# Altium footprint library bethu.PcbLib: 628 footprints (part 5 of 40)
Each footprint in its own frame and in the unit in brackets; x right, y up, seen from the top. Pads: shape width x height; smd on the part's side, far side on the other; paste and mask are expansions set on the pad; w line width, h text height; cw(c..) or ccw(c..) is an arc to the next point about the centre after c.
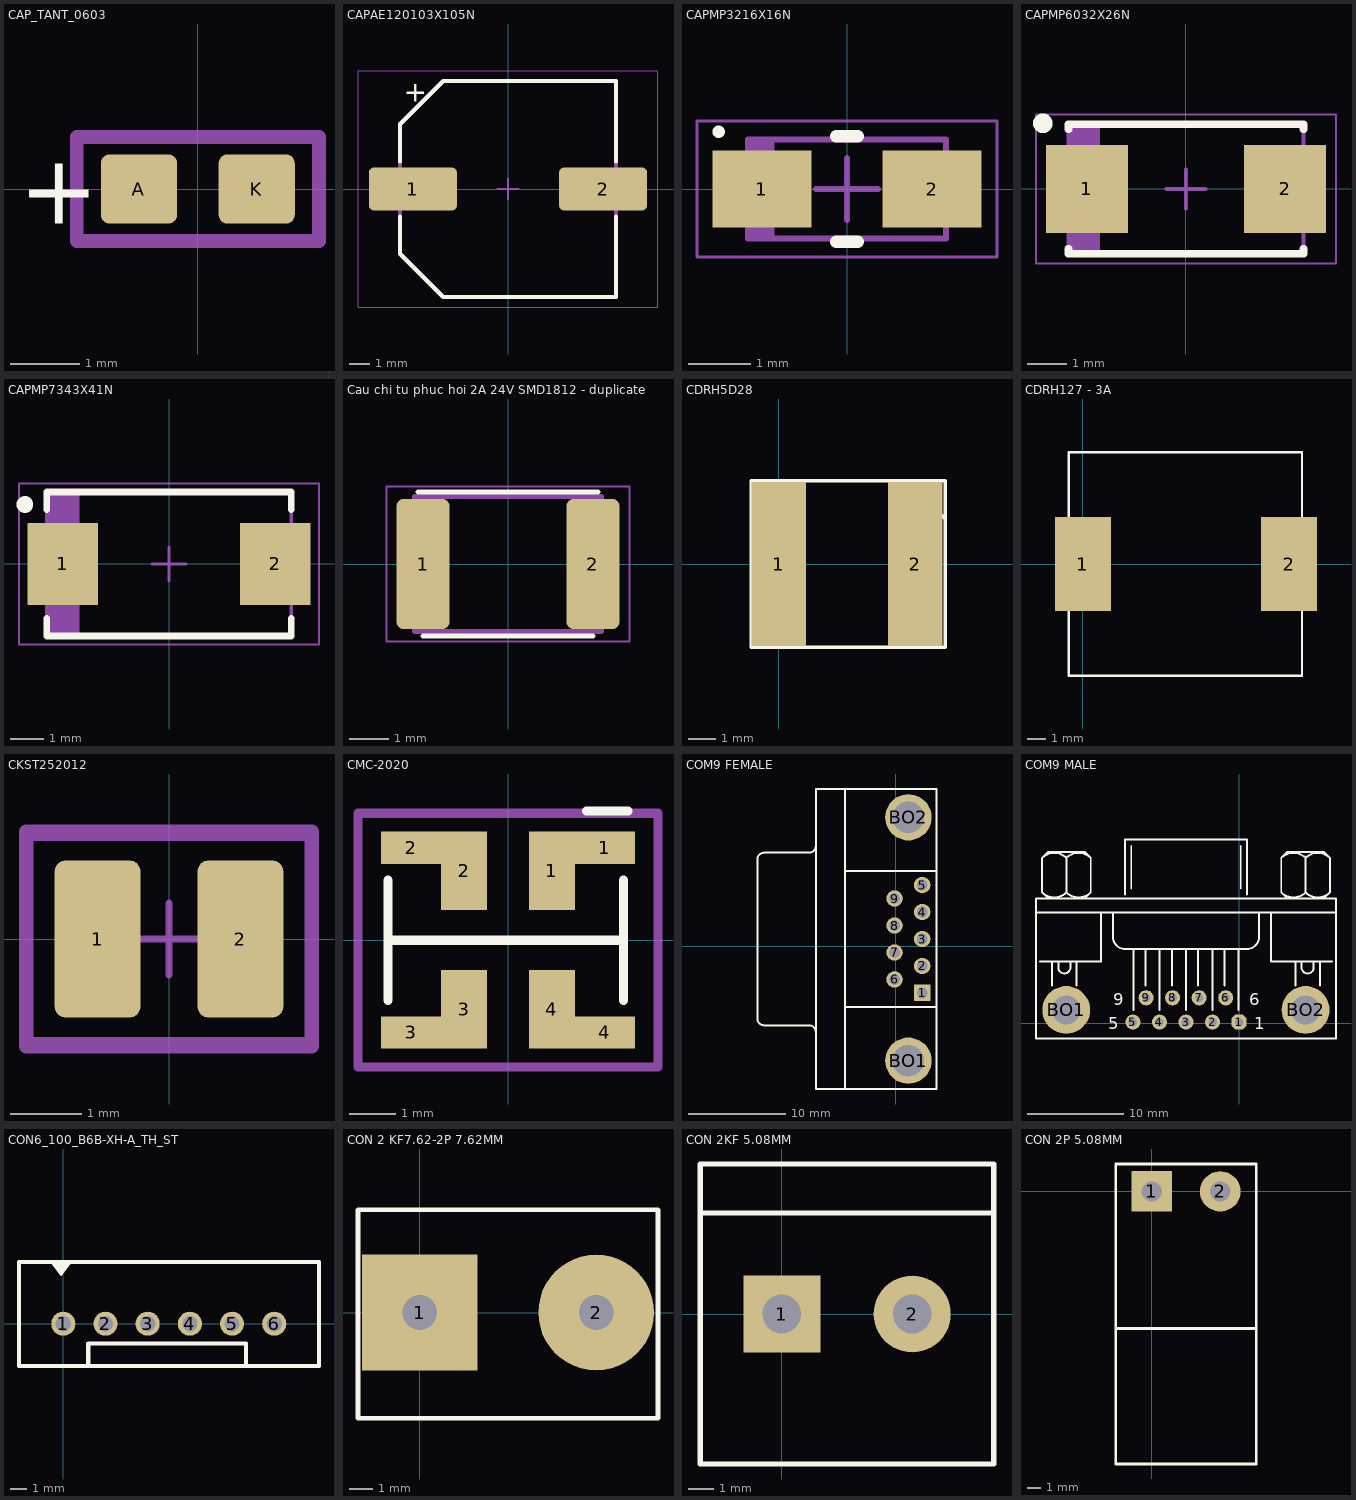
[diagram p4: the footprints below, top view; thin cyan lines are the x and y axes]

## CAP_TANT_0603 [mm]
pads (2):
  rrect25% 1.1x1 smd: A(-0.85,0) K(0.85,0)
Top Overlay:
  text "+" at -2.583,-0.5 h1
Mechanical 13:
  lines w0.2: -1.75,-0.75 1.75,-0.75 1.75,0.75 -1.75,0.75 -1.75,-0.75
  text ".Designator" at -4.998,-0.333 h1
  text "+" at -1.333,1 h1
3D body "CAP_TANT_0603.step": height 0.91, standoff 0.01, extent -0.9,-0.525 0.9,0.525

## CAPAE120103X105N [mm] "Aluminum Electrolytic Capacitor, Body 10.30x10.30x10.50mm, IPC Medium Density"
height 10.5
pads (2):
  rrect25% 4.3x2.1 smd: 1(-4.625,0) 2(4.625,0)
Top Overlay:
  lines w0.2: -5.25,-1.35 -5.25,-3.15 -3.15,-5.25 5.25,-5.25 5.25,-1.35 ; -5.25,1.35 -5.25,3.15 -3.15,5.25 5.25,5.25 5.25,1.35
  text "+" at -5.083,4.25 h1
Mechanical 13:
  lines w0.2: -5.25,-3.15 -3.15,-5.25 5.25,-5.25 5.25,5.25 -3.15,5.25 -5.25,3.15 -5.25,-3.15
  text "'.Designator'" at -5.665,-0.417 h1
  text "+" at -5.083,4.25 h1
Mechanical 15:
  lines w0.05: -7.3,-5.75 -7.3,5.75 7.3,5.75 7.3,-5.75 -7.3,-5.75
  lines w0.1: -0.5,0 0.5,0 ; 0,-0.5 0,0.5
3D body "CAPAE120103X105N.step": height 10.5, standoff 0, extent -6,-5.25 6,5.25

## CAPMP3216X16N [mm] "Molded Capacitor, 2-Leads, Body 3.20x1.60mm, IPC Medium Density"
height 1.6
pads (2):
  rect 1.6x1.25 smd: 1(-1.375,0) 2(1.375,0)
Top Overlay:
  circle w0.1: c-2.075,0.925 r0.05
  lines w0.2: -0.175,-0.85 0.175,-0.85 ; -0.175,0.85 0.175,0.85
Mechanical 13:
  rectangle: -1.6,-0.8 -1.17,0.8
  lines w0.1: -1.6,-0.8 -1.6,0.8 1.6,0.8 1.6,-0.8 -1.6,-0.8
Mechanical 15:
  lines w0.05: -2.425,-1.1 -2.425,1.1 2.425,1.1 2.425,-1.1 -2.425,-1.1
  lines w0.1: -0.5,0 0.5,0 ; 0,-0.5 0,0.5
3D body "User Library-CAP_TANT_3216-18_A_case.STEP": height 1.8, standoff 0, extent -1.7,-0.9 1.7,0.9

## CAPMP6032X26N [mm] "Molded Capacitor, 2-Leads, Body 6.00x3.20mm, IPC Medium Density"
height 2.6
pads (2):
  rect 2.1x2.25 smd: 1(-2.525,0) 2(2.525,0)
Top Overlay:
  circle w0.25: c-3.65,1.675 r0.125
  lines w0.2: -3,-1.525 -3,-1.65 3,-1.65 3,-1.525 ; -3,1.525 -3,1.65 3,1.65 3,1.525
Mechanical 13:
  rectangle: -3,-1.6 -2.193,1.6
  lines w0.1: -3,-1.6 3,-1.6 3,1.6 -3,1.6 -3,-1.6
Mechanical 15:
  lines w0.05: -3.825,-1.9 3.825,-1.9 3.825,1.9 -3.825,1.9 -3.825,-1.9
  lines w0.1: -0.5,0 0.5,0 ; 0,-0.5 0,0.5
3D body "User Library-CAP_TANT_6032-28_y.STEP": height 2.8, standoff 0, extent -3.15,-1.75 3.15,1.75

## CAPMP7343X41N [mm] "Molded Capacitor, 2-Leads, Body 7.30x4.30mm, IPC Medium Density"
height 4.1
pads (2):
  rect 2.1x2.45 smd: 1(-3.175,0) 2(3.175,0)
Top Overlay:
  circle w0.25: c-4.3,1.775 r0.125
  lines w0.2: -3.65,-1.625 -3.65,-2.15 3.65,-2.15 3.65,-1.625 ; -3.65,1.625 -3.65,2.15 3.65,2.15 3.65,1.625
Mechanical 13:
  rectangle: -3.65,-2.15 -2.668,2.15
  lines w0.1: -3.65,-2.15 3.65,-2.15 3.65,2.15 -3.65,2.15 -3.65,-2.15
Mechanical 15:
  lines w0.05: -4.475,-2.4 4.475,-2.4 4.475,2.4 -4.475,2.4 -4.475,-2.4
  lines w0.1: -0.5,0 0.5,0 ; 0,-0.5 0,0.5
3D body "User Library-CAP_TANT_7343-40.STEP": height 4, standoff 0, extent -3.8,-2.3 3.8,2.3

## Cau chi tu phuc hoi 2A 24V SMD1812 - duplicate [mm]
pads (2):
  rrect25% 1.34x3.29 smd: 1(-2.15,0) 2(2.15,0)
Top Overlay:
  lines w0.127: -2.28,1.825 2.28,1.825 ; -2.15,-1.825 2.15,-1.825
Mechanical 13:
  lines w0.127: -2.37,-1.71 -2.37,1.71 2.37,1.71 2.37,-1.71 -2.37,-1.71
Mechanical 15:
  lines w0.05: -3.07,-1.96 -3.07,1.96 3.07,1.96 3.07,-1.96 -3.07,-1.96
3D body "step_temp.STEP": height 1.25, standoff 0, extent -2.275,-1.62 2.275,1.62

## CDRH5D28 [mm] "6x6x3mm"
pads (2):
  rect 2x6 smd: 1(0,0) 2(5,0)
Top Overlay:
  lines w0.127: -1.016,-1.651 0.381,-3.048 ; 4.699,3.048 6.096,1.651 ; -1.016,-3.048 6.096,-3.048 6.096,3.048 -1.016,3.048 -1.016,-3.048
3D body "User Library-cdrh5d28.STEP": height 3, standoff 0, extent -0.508,-3 5.492,3

## CDRH127 - 3A [mm] "12x12x7mm"
pads (2):
  rect 3x5 smd: 1(0,0) 2(11,0)
Top Overlay:
  lines w0.127: -0.762,-5.969 -0.762,5.969 11.684,5.969 11.684,-5.969 -0.762,-5.969
3D body "SUMIDA-CDRH127-DEFAULT.STEP": height 7.4, standoff -0.05, extent -0.71,-6 11.632,6

## CKST252012 [mm]
height 1.2
pads (2):
  rrect25% 1.2x2.2 smd: 1(-1,0) 2(1,0)
Mechanical 13:
  lines w0.2: -2,-1.5 -2,1.5 2,1.5 2,-1.5 -2,-1.5
  text "'.Designator'" at -5.665,-0.417 h1
Mechanical 15:
  lines w0.05: -1.95,-1.4 -1.95,1.4 1.95,1.4 1.95,-1.4 -1.95,-1.4
  lines w0.1: -0.5,0 0.5,0 ; 0,-0.5 0,0.5
3D body "CKST252012.step": height 1.2, standoff 0, extent -1.35,-1.1 1.35,1.1

## CMC-2020 [mm]
height 2.5
pads (8):
  rect 1x1.7 smd: 1(0.95,1.5) 2(-0.95,1.5) 3(-0.95,-1.5) 4(0.95,-1.5)
  rect 1.3x0.7 smd: 1(2.1,2) 2(-2.1,2) 3(-2.1,-2) 4(2.1,-2)
Top Overlay:
  lines w0.2: -2.6,-1.3 -2.6,1.3 ; -2.6,0 2.5,0 ; 1.7,2.8 2.6,2.8 ; 2.5,-1.3 2.5,1.3
Mechanical 13:
  circle w0.35: c2.25,2 r0.15
  lines w0.2: -3.25,-2.75 -3.25,2.75 3.25,2.75 3.25,-2.75 -3.25,-2.75
  text "'.Designator'" at -5.665,-0.417 h1
3D body "DLW5BTM251SQ2L.STEP": height 2.51, standoff 0.01, extent -2.5,-2.5 2.5,2.5

## COM9 FEMALE [mm]
pads (11):
  rect 1.69x1.69 hole 1.09: 1(2.715,-4.78)
  round 1.69 hole 1.09: 2(2.715,-2.01) 3(2.715,0.76) 4(2.715,3.53) 5(2.715,6.3) 6(-0.125,-3.395) 7(-0.125,-0.625) 8(-0.125,2.145) 9(-0.125,4.915)
  round 4.76 hole 3.26: BO1(1.295,-11.735) BO2(1.295,13.255)
Top Overlay:
  lines w0.2: -13.51,-8.1 cw(c-13.51,-7.405) -14.205,-7.405 -14.205,8.925 cw(c-13.51,8.925) -13.51,9.62 ; -13.505,-8.105 -8.905,-8.105 cw(c-8.905,-8.8) -8.21,-8.8 ; -13.505,9.625 -8.905,9.625 ccw(c-8.905,10.32) -8.21,10.32 ; -5.205,-14.64 -5.205,16.16 ; -5.205,-6.24 4.195,-6.24 ; -5.205,7.76 4.195,7.76 ; -8.205,-14.64 -8.205,16.16 4.195,16.16 4.195,-14.64 -8.205,-14.64
3D body "User Library-DB9-Usa.STEP": height 12.77, standoff -4.1, extent -13.928,-14.643 4.372,16.167

## COM9 MALE [mil]
pads (11):
  oct 62x62 hole 35: 1(0,5)
  round 62 hole 35: 2(-109.17,5) 3(-218.33,5) 4(-327.5,5) 5(-436.67,5) 6(-55,105) 7(-164.17,105) 8(-273.33,105) 9(-382.5,105)
  round 196.67 hole 118.33: BO1(-710.83,55) BO2(273.33,55)
Top Overlay:
  lines w8: -835,455 398.33,455 ; -818.33,255 -568.33,255 -568.33,455 ; -810.09,538.25 ccw(c-760,588.33) -709.91,538.25 ; -810.09,680.09 cw(c-760,630) -709.91,680.09 ; -785,513.33 -810,538.33 -810,680 -785,705 -635,705 -610,680 -610,538.33 -635,513.33 ; -768.33,155 -768.33,255 ; -743.33,255 -743.33,230 ccw(c-718.33,230) -693.33,230 -693.33,255 ; -710.09,538.25 ccw(c-660,588.33) -609.91,538.25 ; -710.09,680.09 cw(c-660,630) -609.91,680.09 ; -710,538.33 -710,680 ; -668.33,155 -668.33,255 ; -518.33,455 -518.33,355 ccw(c-468.33,355) -468.33,305 31.67,305 ccw(c31.67,355) 81.67,355 81.67,455 ; -468.33,530 -468.33,755 31.67,755 31.67,530 ; -443.33,555 -443.33,730 ; -435,55 -435,305 ; -385,155 -385,305 ; -326.67,55 -326.67,305 ; -276.67,155 -276.67,305 ; -218.33,55 -218.33,305 ; -168.33,155 -168.33,305 ; -110,55 -110,305 ; -60,155 -60,163.33 -60,305 ; -1.67,55 -1.67,305 ; 6.67,555 6.67,730 ; 131.67,455 131.67,255 381.67,255 ; 173.25,538.25 ccw(c223.33,588.33) 273.42,538.25 ; 173.25,680.09 cw(c223.33,630) 273.42,680.09 ; 198.33,513.33 173.33,538.33 173.33,680 198.33,705 348.33,705 373.33,680 373.33,538.33 348.33,513.33 ; 231.67,155 231.67,255 ; 256.67,255 256.67,230 ccw(c281.67,230) 306.67,230 306.67,255 ; 273.25,538.25 ccw(c323.33,588.33) 373.42,538.25 ; 273.25,680.09 cw(c323.33,630) 373.42,680.09 ; 273.33,538.33 273.33,680 ; 331.67,155 331.67,255 ; -835,-61.67 398.33,-61.67 398.33,513.33 -835,513.33 -835,-61.67
  text "6" at 41.67,75 h50
  text "1" at 61.67,-25 h50
  text "5" at -538.33,-25 h50
  text "9" at -518.33,75 h50
3D body "14315.stp": height 478.54, standoff -185.83, extent -821.49,-62.67 391.5,760.16

## CON6_100_B6B-XH-A_TH_ST [mm] "Connector Header"
height 7
pads (6):
  round 1.45 hole 0.91: 1(0,0) 2(2.54,0) 3(5.08,0) 4(7.62,0) 5(10.16,0) 6(12.7,0)
Top Overlay:
  region: -0.635,3.658 0.33,3.658 0.33,3.454 -0.127,2.997
  lines w0.127: -0.686,3.683 -0.133,2.946 0.449,3.695
  lines w0.254: 1.5,-2.5 1.5,-1.2 11,-1.2 11,-2.5 ; -2.667,-2.54 15.392,-2.54 15.392,3.708 -2.667,3.708 -2.667,-2.54
3D body "JST XH 6 S6B-XH-A1 shrouded header connector.SLDPRT": height 7, standoff -3.45, extent -2.42,-2.321 15.12,3.429

## CON 2 KF7.62-2P 7.62MM [mm] "Connector; Header; 2 Position"
pads (2):
  rect 5x5 hole 1.5: 1(0,0)
  round 5 hole 1.5: 2(7.62,0)
Top Overlay:
  lines w0.2: -2.667,-4.572 -2.667,4.445 10.287,4.445 10.287,-4.572 -2.667,-4.572
3D body "User Library-2 Way PCB Screw Terminal Block 7_62mm.STEP": height 15.2, standoff -3.5, extent -2.54,-4.555 10.16,4.445

## CON 2KF 5.08MM [mm] "Connector; Header; 2 Position"
pads (2):
  rect 3x3 hole 1.5: 1(0,0)
  round 3 hole 1.5: 2(5.08,0)
Top Overlay:
  lines w0.2: -3.175,3.937 8.255,3.937 ; -3.175,-5.842 8.255,-5.842 8.255,5.842 -3.175,5.842 -3.175,-5.842
3D body "37832.stp": height 18, standoff -3.8, extent -3.13,-5.842 8.21,5.778

## CON 2P 5.08MM [mm] "Connector; Header; 2 Position"
pads (2):
  rect 3x3 hole 1.5: 1(0,0)
  round 3 hole 1.5: 2(5.08,0)
Top Overlay:
  lines w0.2: -2.667,-10.16 7.747,-10.16 ; -2.667,-20.193 7.747,-20.193 7.747,2.032 -2.667,2.032 -2.667,-20.193
3D body "User Library-MSTB 2,5-2-G-5,08 1770711.STEP": height 8.6, standoff -3.5, extent -2.54,-10.065 7.62,1.937
3D body "14031.stp": height 15.17, standoff 0.17, extent -2.54,-20.105 7.62,-1.905